# Altium footprint library heromap.PcbLib: 593 footprints (part 6 of 38)
Each footprint in its own frame and in the unit in brackets; x right, y up, seen from the top. Pads: shape width x height; smd on the part's side, far side on the other; paste and mask are expansions set on the pad; w line width, h text height; cw(c..) or ccw(c..) is an arc to the next point about the centre after c.
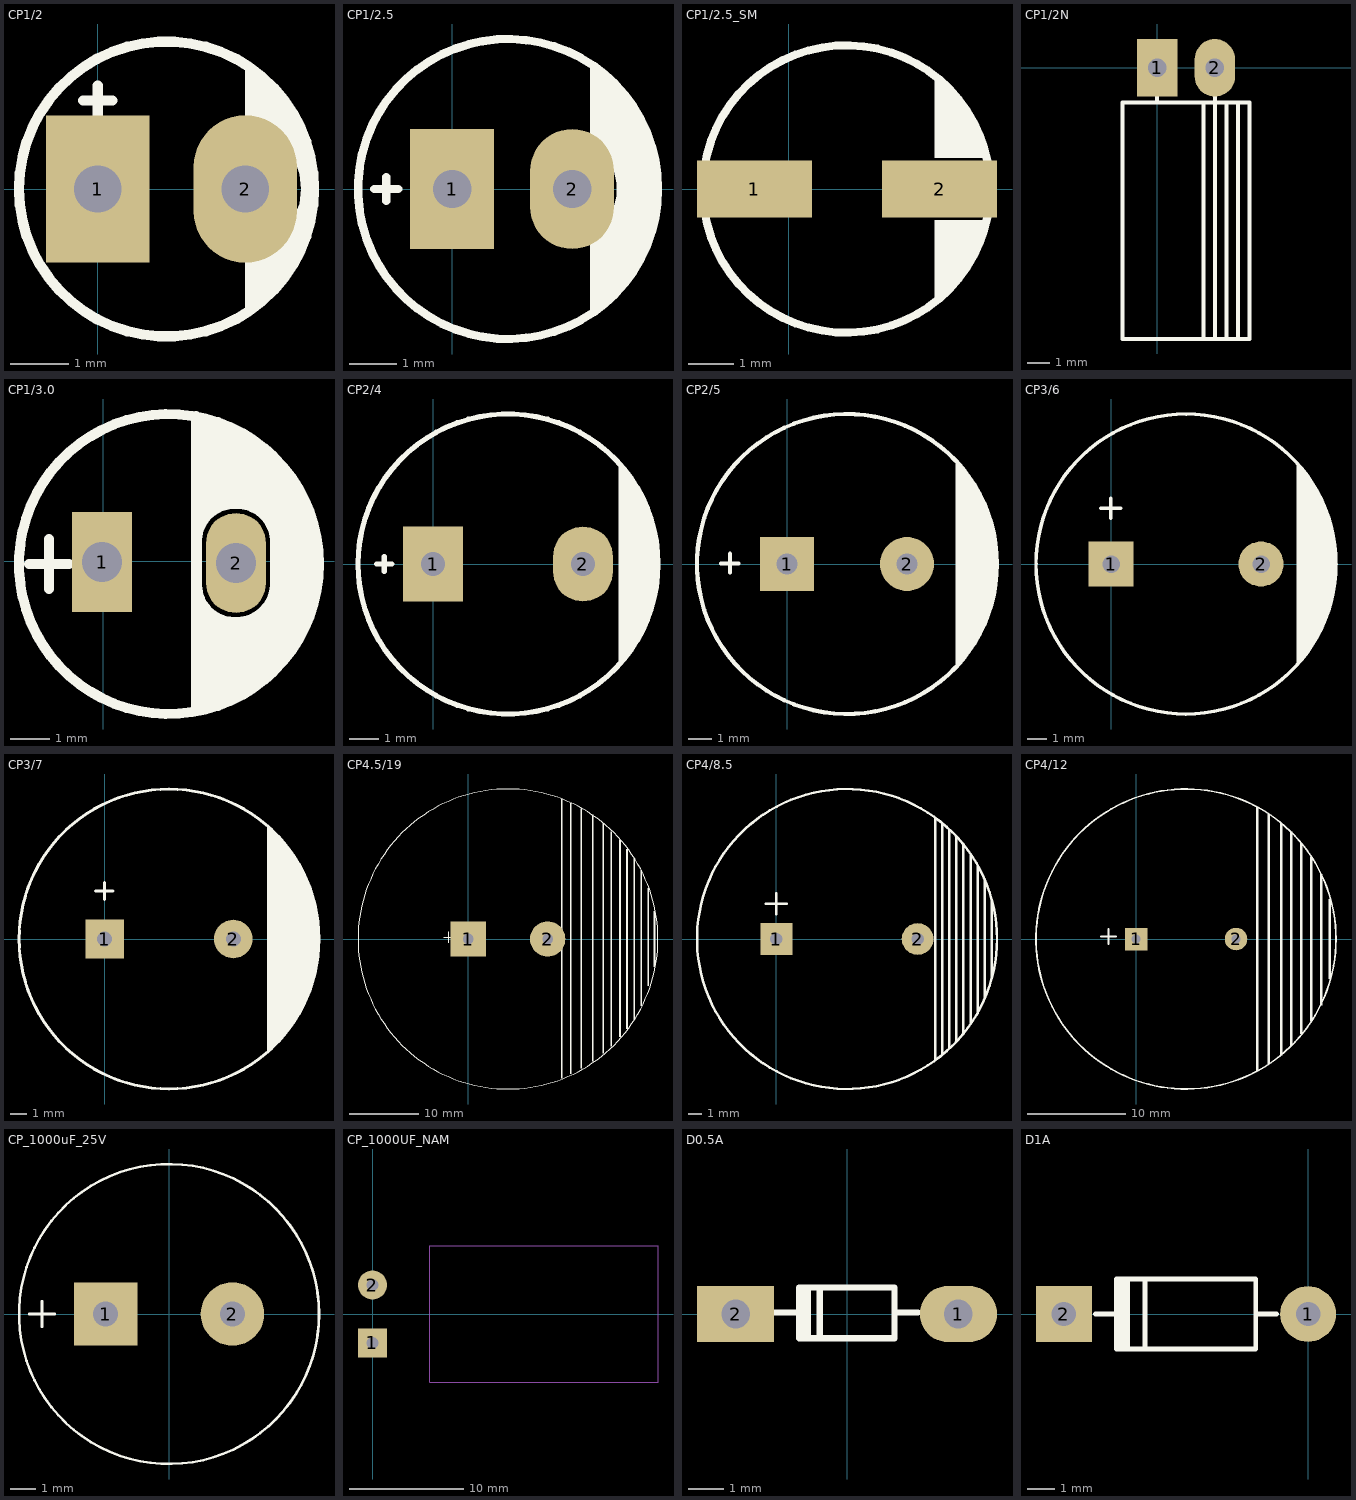
[diagram p5: the footprints below, top view; thin cyan lines are the x and y axes]

## CP1/2 [mil] "Tu hoa < 22uF/16>50V"
height 300
pads (2):
  rect 70x100 hole 32: 1(0,0)
  oval 70x100 hole 32: 2(100,0)
Top Overlay:
  circle w7: c46.58,0 r100
  region: 100,84 100,38 112,36 122,32 129,27 134,19 137,10 138,0 137,-10 134,-17 129,-24 123,-31 117,-35 107,-38 100,-38 100,-85 108,-78 120,-69 128,-59 137,-44 144,-19 146,9 139,40 127,60 110,79
  lines w7: -10,60 10,60 ; 0,50 0,70
3D body "User Library-Cap electro 5x7x2mm.STEP": height 296.28, standoff -128.81, extent -54.43,-98.85 144.43,100

## CP1/2.5 [mil] "Tu hoa 33 >100 uF,50V, 220uF/16V,25V"
height 300
pads (2):
  rect 70x100 hole 32: 1(0,0)
  oval 70x100 hole 32: 2(100,0)
Top Overlay:
  circle w7: c46.58,0 r125
  region: 115,105 115,36 122,31 129,25 133,20 135,15 137,5 137,-6 135,-14 132,-19 128,-24 124,-28 120,-31 115,-34 115,-107 124,-99 139,-86 152,-69 167,-36 171,-15 171.58,0 167,30 153,67 131,93
  lines w7: -65,0 -45,0 ; -55,-10 -55,-5 -55,5 -55,10
3D body "User Library-Cap 6_3x11.STEP": height 421.54, standoff -759.57, extent -76,-124.03 172.03,124

## CP1/2.5_SM [mil] "Tu hoa SMD 33 >100 uF,50V, 220uF/16V,25V"
height 100
pads (2):
  rect 100x50 smd: 1(-30,0) 2(131,0)
Top Overlay:
  circle w7: c50,0 r125
  region: 127,98 127,27 172,27 173,9 170,-26 169.75,-27 127,-27 127,-98 141,-86 156,-67 170,-38 175,-19 175,18 170,37 162,58 146,82
  lines w7: -65,0 -45,0 ; -55,-10 -55,-5 -55,5 -55,10

## CP1/2N [mil] "Tu hoa < 22uF/16>50V"
height 300
pads (2):
  rect 70x100 hole 32: 1(0,0)
  oval 70x100 hole 32: 2(100,0)
Top Overlay:
  lines w7: 0,-60 0,-45 ; 80,-470 80,-60 ; 100,-470 100,-60 100,-45 ; 120,-470 120,-60 ; 140,-470 140,-60 ; -60,-470 -60,-60 160,-60 160,-470 -60,-470
3D body "User Library-Cap electro 5x7x2mm RA.STEP": height 199.43, standoff -136.22, extent -60,-378.48 138.85,-11.52

## CP1/3.0 [mil]
pads (2):
  rect 60x100 hole 40: 1(-1,-1)
  oval 60x100 hole 40: 2(133,-2)
Top Overlay:
  circle w10: c66,-3 r150
  region: 93,146 93,37 121,58 143,58 165,42 174,-3 166,-43 141,-62 106,-53 92,-36 93,-150 152,-128 208,-60 216,16 185,93 139,129
  lines w10: -74,-3 -34,-3 ; -54,-28 -54,22 ; 93,-147 93,145 ; 94,-27 94,22 cw(c131.5,19.5) 131.01,57.08 ; 94,-25 ccw(c131.5,-23.5) 133,-61 ccw(c133.5,-22.5) 172,-23 ; 131,57 cw(c134,19) 172,22 ; 172,-30 172,25
3D body "User Library-CAP 8X11_5.STEP": height 475.89, standoff -724.41, extent -90,-161.48 224.96,153.48

## CP2/4 [mil] "Tu hoa 1000uF/16V/25V"
height 400
pads (2):
  rect 80x100 hole 32: 1(0,0)
  oval 80x100 hole 32: 2(200,0)
Top Overlay:
  circle w7: c100,0 r200
  region: 248,133 248,-134 262,-117 274,-97 284,-81 293,-55 299,-21 298,21 296,46 281,85 258,122
  lines w7: -75,0 -55,0 ; -65,-10 -65,10

## CP2/5 [mil] "Tu hoa 1000uF/25V,50V"
height 600
pads (2):
  rect 90x90 hole 35: 1(0,0)
  round 90 hole 35: 2(200,0)
Top Overlay:
  circle w7: c100,0 r250
  region: 281,174 281,-175 300,-149 301,-151 318,-124 334,-90 349,-29 350,0 348,34 341,70 321,116
  lines w7: -110,1 -81,1 ; -95,-14 -95,17
3D body "User Library-Cap12_5x25.STEP": height 688.98, standoff -1042.82, extent -147.06,-247 345.06,245.12

## CP3/6 [mil] "Tu hoa 4700uF/25V"
height 600
pads (2):
  rect 90x90 hole 35: 1(0,0)
  round 90 hole 35: 2(300,0)
Top Overlay:
  circle w7: c150,0 r300
  region: 425,112 433,96 442,79 447,39 450,-9 449,-34 442,-69 429,-115 397,-171 382,-191 371,-203 371,200 384.5,182.5 395,168 408,153
  lines w7: -21,112 19,112 ; -1,92 -1,132
3D body: height 1220.47, standoff 39.37, extent -143.95,-295.69 444.28,293.7

## CP3/7 [mil] "Tu hoa 47uF/450V"
height 600
pads (2):
  rect 90x90 hole 35: 1(0,0)
  round 90 hole 35: 2(300,0)
Top Overlay:
  circle w7: c150,0 r350
  region: 379,265 379,-263 429,-213 476,-134 500,-33 495,69 453,179 416,230
  lines w7: -21,112 19,112 ; -1,92 -1,132
3D body: height 39.37, standoff -157.48, extent 280.47,-19.64 319.69,19.65
3D body: height 39.37, standoff -157.48, extent -19.53,-19.64 19.69,19.65
3D body: height 944.88, standoff 39.37, extent -198.24,-350.3 499,348.31

## CP4.5/19 [mil] "Tu hoa 10,000uF/63V"
height 600
pads (2):
  rect 200x200 hole 60: 1(0,0)
  round 200 hole 60: 2(450,0)
Top Overlay:
  circle w7: c225,0 r850
  rectangle: 525,-790 535,795
  rectangle: 575,-765 585,770
  rectangle: 635,-735 645,740
  rectangle: 700,-695 710,705
  rectangle: 1050,-160 1060,160
  rectangle: 1015,-265 1025,290
  rectangle: 760,-650 770,655
  rectangle: 805,-610 815,610
  rectangle: 855,-555 865,560
  rectangle: 895,-510 905,510
  rectangle: 935,-455 945,455
  rectangle: 975,-380 985,390
  lines w7: -140,10 -80,10 ; -110,-20 -110,40

## CP4/8.5 [mil] "Tu hoa 4700uF/50V"
height 600
pads (2):
  rect 90x90 hole 35: 1(0,0)
  round 90 hole 35: 2(400,0)
Top Overlay:
  circle w7: c200,0 r425
  lines w7: -30,100 30,100 ; 0,70 0,130 ; 450,-340 450,340 ; 470,-325 470,325 ; 490,-310 490,310 ; 510,-290 510,290 ; 530,-265 530,265 ; 550,-240 550,240 ; 570,-210 570,205 ; 590,-165 590,170
  lines w8: 610,-110 610,110
3D body "User Library-ECEC2DP271BJ.STEP": height 984.25, standoff 0, extent -236.14,-438.07 630,428.07

## CP4/12 [mil] "Tu hoa 220uF/450V"
height 600
pads (2):
  rect 90x90 hole 35: 1(0,0)
  round 90 hole 35: 2(400,0)
Top Overlay:
  circle w7: c200,0 r600
  rectangle: 695,-330 705,330
  rectangle: 655,-380 665,385
  rectangle: 615,-425 625,430
  rectangle: 575,-465 585,465
  rectangle: 525,-500 535,500
  rectangle: 480,-530 490,530
  rectangle: 735,-265 745,260
  rectangle: 770,-160 780,160
  lines w7: -140,10 -80,10 ; -110,-20 -110,40

## CP_1000uF_25V [mil]
pads (2):
  rect 100x100 hole 40: 1(-100,0)
  round 100 hole 40: 2(100,0)
Top Overlay:
  circle w4: c0,0 r236.22
  lines w4: -220,0 -180,0 ; -200,-20 -200,20
3D body: height 118.11, standoff 39.37, extent 236.3,-5.66 237,5.66
3D body: height 511.81, standoff 393.7, extent 236.3,-5.66 237,5.66
3D body: height 791.34, standoff 0, extent 223.5,-76.82 236.8,77.63
3D body: height 39.37, standoff -39.37, extent 84.27,-15.73 115.73,15.73
3D body: height 39.37, standoff -39.37, extent -115.73,-15.73 -84.27,15.73
3D body: height 791.34, standoff 748.03, extent -220.02,-196.87 196.87,196.87
3D body: height 787.4, standoff 0, extent -236.2,-236.2 236.2,236.2

## CP_1000UF_NAM [mil]
height 47.24
pads (2):
  rect 100x100 hole 40: 1(-1,-100)
  round 100 hole 40: 2(-1,100)
Mechanical 1:
  lines w4: 197.24,-236.22 983.86,-236.22 983.86,236.22 197.24,236.22 197.24,-236.22
3D body: height 589, standoff 196.85, extent 196.87,-196.83 984.27,196.09
3D body: height 628.06, standoff 157.48, extent 197.27,-236.2 983.88,235.31
3D body: height 413.23, standoff 374.02, extent -3,78.74 233.22,118.03
3D body: height 413.39, standoff 374.02, extent -21.05,79.95 18.11,119.15
3D body: height 393.7, standoff -78.74, extent -20.66,80.34 18.67,119.67
3D body: height 393.7, standoff -78.74, extent -20.66,-119.66 18.67,-80.33
3D body: height 413.39, standoff 374.02, extent -21.05,-120.05 18.11,-80.85
3D body: height 413.23, standoff 374.02, extent -3,-121.26 233.22,-81.97

## D0.5A [mm] "Diode muoi, W 80mil, L 300mil"
height 2.032
pads (2):
  oval 2.2x1.6 hole 0.813: 1(3.175,0)
  rect 2.2x1.6 hole 0.813: 2(-3.175,0)
Top Overlay:
  rectangle: -1.414,-0.719 -1.033,0.678
  lines w0.178: -2.049,0.043 -1.363,0.043 ; -0.779,-0.693 -0.779,0.754 ; 1.355,0.043 2.015,0.043 ; -1.363,-0.693 -1.363,0.754 1.355,0.754 1.355,-0.693 -1.363,-0.693
3D body "SW3dPS-1N4148.STEP": height 1.56, standoff -1.27, extent -2.773,-0.794 2.739,0.856

## D1A [mil] "Diode 1A, W 100mil, L 350mil"
height 100
pads (2):
  round 80 hole 35: 1(0,0)
  rect 80x80 hole 35: 2(-350,0)
Top Overlay:
  rectangle: -275,-50 -255,50
  lines w7: -305,0 -275,0 ; -275,-16 -275,0 ; -275,21 -275,0 ; -234,-50 -234,47 ; -75,0 -45,0 ; -275,0 -275,50 -75,50 -75,-50 -275,-50 -275,0
3D body: height -59.06, standoff -90.55, extent -366.01,-14.96 -334.68,16.4
3D body: height -59.06, standoff -90.55, extent -15.59,-15.69 15.74,15.67
3D body: height 59.06, standoff -39.37, extent -15.76,-15.73 15.61,15.71
3D body: height 74.68, standoff 43.31, extent -196.86,-15.72 -0.01,15.71
3D body: height 74.68, standoff 43.31, extent -350.43,-15 -153.57,16.44
3D body: height 59.06, standoff -39.37, extent -366.04,-14.99 -334.67,16.44
3D body: height 100.07, standoff 17.72, extent -250.84,-41.52 -231.16,41
3D body: height 98.11, standoff 19.68, extent -271.85,-39.29 -75,39.29